# Altium schematic symbol library Capacitor - Ceramic - Sumsung.SchLib: 1421 symbols (part 5 of 8)
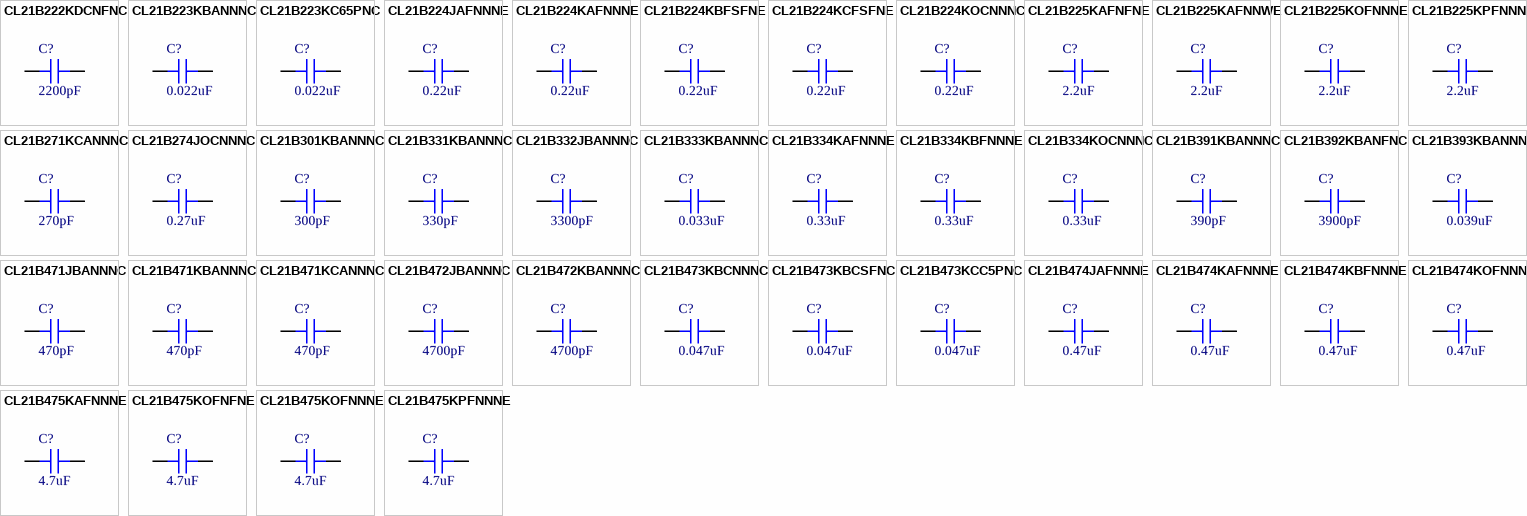
[diagram p39: symbols CL21B222KDCNFNC to CL21B475KPFNNNE]

## CL21B225KAFNNWE
designator C?, comment 2.2uF
CAP CER 2.2UF 25V X7R 0805; Part Number: CL21B225KAFNNWE; Manufacturer: Samsung Electro-Mechanics America, Inc.; TemperatureRange: -55C ~ 125C; Tolerance: 10%; Value: 2.2uF; PartId: 13943; Supplier 1: Digi-Key; Supplier Part Number 1: 1276-2955-2-ND; ComponentLink1Description: Datasheet; ComponentLink1URL: //media.digikey.com/pdf/Data%20Sheets/Samsung%20PDFs/CL21B225KAFNNWE_Spec.pdf; ComponentLink2Description: Digi-Key Listing; ComponentLink2URL: https://www.digikey.com/product-detail/en/samsung-electro-mechanics-america-inc/CL21B225KAFNNWE/1276-2955-2-ND/3888613; TemperatureCoefficient: X7R; Voltage: 25V; Price: 0.0374; Device Package: 0805 (2012 Metric)
footprint CAP 0805/2012
pins: 1, 2

## CL21B225KOFNNNE
designator C?, comment 2.2uF
CAP CER 2.2UF 16V X7R 0805; Part Number: CL21B225KOFNNNE; Manufacturer: Samsung Electro-Mechanics America, Inc.; TemperatureRange: -55C ~ 125C; Tolerance: 10%; Value: 2.2uF; PartId: 13949; Supplier 1: Digi-Key; Supplier Part Number 1: 1276-1162-2-ND; ComponentLink1Description: Datasheet; ComponentLink1URL: http://www.samsungsem.com/kr/support/product-search/mlcc/CL21B225KOFNNNE.jsp; ComponentLink2Description: Digi-Key Listing; ComponentLink2URL: https://www.digikey.com/product-detail/en/samsung-electro-mechanics-america-inc/CL21B225KOFNNNE/1276-1162-2-ND/3886820; TemperatureCoefficient: X7R; Voltage: 16V; Price: 0.033; Device Package: 0805 (2012 Metric)
footprint CAP 0805/2012
pins: 1, 2

## CL21B225KPFNNNE
designator C?, comment 2.2uF
CAP CER 2.2UF 10V X7R 0805; Part Number: CL21B225KPFNNNE; Manufacturer: Samsung Electro-Mechanics America, Inc.; TemperatureRange: -55C ~ 125C; Tolerance: 10%; Value: 2.2uF; PartId: 5880; Supplier 1: Digi-Key; Supplier Part Number 1: 1276-1188-2-ND; ComponentLink1Description: Datasheet; ComponentLink1URL: http://www.samsungsem.com/kr/support/product-search/mlcc/CL21B225KPFNNNE.jsp; ComponentLink2Description: Digi-Key listing; ComponentLink2URL: http://digikey.com/product-detail/en/CL21B225KPFNNNE/1276-1188-2-ND/3886846; TemperatureCoefficient: X7R; Voltage: 10V; Price: 0.0314; Type: -; Device Package: 0805 (2012 Metric)
footprint CAP 0805/2012
pins: 1, 2

## CL21B271KCANNNC
designator C?, comment 270pF
CAP CER 270PF 100V X7R 0805; Part Number: CL21B271KCANNNC; Manufacturer: Samsung Electro-Mechanics America, Inc.; TemperatureRange: -55C ~ 125C; Tolerance: 10%; Value: 270pF; PartId: 5693; Supplier 1: Digi-Key; Supplier Part Number 1: 1276-2494-2-ND; ComponentLink1Description: Datasheet; ComponentLink1URL: http://media.digikey.com/pdf/Data%20Sheets/Samsung%20PDFs/CL21B271KCANNNC_Spec.pdf; ComponentLink2Description: Digi-Key listing; ComponentLink2URL: http://digikey.com/product-detail/en/CL21B271KCANNNC/1276-2494-2-ND/3888152; TemperatureCoefficient: X7R; Voltage: 100V; Price: 0.0078; Type: -; Device Package: 0805 (2012 Metric)
footprint CAP 0805/2012
pins: 1, 2

## CL21B274JOCNNNC
designator C?, comment 0.27uF
CAP CER 0.27UF 16V X7R 0805; Part Number: CL21B274JOCNNNC; Manufacturer: Samsung Electro-Mechanics America, Inc.; TemperatureRange: -55C ~ 125C; Tolerance: 5%; Value: 0.27uF; PartId: 5945; Supplier 1: Digi-Key; Supplier Part Number 1: 1276-2497-2-ND; ComponentLink1Description: Datasheet; ComponentLink1URL: http://www.samsungsem.com/kr/support/product-search/mlcc/CL21B274JOCNNNC.jsp; ComponentLink2Description: Digi-Key listing; ComponentLink2URL: http://digikey.com/product-detail/en/CL21B274JOCNNNC/1276-2497-2-ND/3888155; TemperatureCoefficient: X7R; Voltage: 16V; Price: 0.0457; Type: -; Device Package: 0805 (2012 Metric)
footprint CAP 0805/2012
pins: 1, 2

## CL21B301KBANNNC
designator C?, comment 300pF
CAP CER 300PF 50V X7R 0805; Part Number: CL21B301KBANNNC; Manufacturer: Samsung Electro-Mechanics America, Inc.; TemperatureRange: -55C ~ 125C; Tolerance: 10%; Value: 300pF; PartId: 5668; Supplier 1: Digi-Key; Supplier Part Number 1: 1276-2499-2-ND; ComponentLink1Description: Datasheet; ComponentLink1URL: http://www.samsungsem.com/kr/support/product-search/mlcc/CL21B301KBANNNC.jsp; ComponentLink2Description: Digi-Key listing; ComponentLink2URL: http://digikey.com/product-detail/en/CL21B301KBANNNC/1276-2499-2-ND/3888157; TemperatureCoefficient: X7R; Voltage: 50V; Price: 0.0051; Type: -; Device Package: 0805 (2012 Metric)
footprint CAP 0805/2012
pins: 1, 2

## CL21B331KBANNNC
designator C?, comment 330pF
CAP CER 330PF 50V X7R 0805; Part Number: CL21B331KBANNNC; Manufacturer: Samsung Electro-Mechanics America, Inc.; TemperatureRange: -55C ~ 125C; Tolerance: 10%; Value: 330pF; PartId: 5739; Supplier 1: Digi-Key; Supplier Part Number 1: 1276-1765-2-ND; ComponentLink1Description: Datasheet; ComponentLink1URL: http://www.samsungsem.com/kr/support/product-search/mlcc/CL21B331KBANNNC.jsp; ComponentLink2Description: Digi-Key listing; ComponentLink2URL: http://digikey.com/product-detail/en/CL21B331KBANNNC/1276-1765-2-ND/3887423; TemperatureCoefficient: X7R; Voltage: 50V; Price: 0.0153; Type: -; Device Package: 0805 (2012 Metric)
footprint CAP 0805/2012
pins: 1, 2

## CL21B332JBANNNC
designator C?, comment 3300pF
CAP CER 3300PF 50V X7R 0805; Part Number: CL21B332JBANNNC; Manufacturer: Samsung Electro-Mechanics America, Inc.; TemperatureRange: -55C ~ 125C; Tolerance: 5%; Value: 3300pF; PartId: 5858; Supplier 1: Digi-Key; Supplier Part Number 1: 1276-2501-2-ND; ComponentLink1Description: Datasheet; ComponentLink1URL: http://www.samsungsem.com/kr/support/product-search/mlcc/CL21B332JBANNNC.jsp; ComponentLink2Description: Digi-Key listing; ComponentLink2URL: http://digikey.com/product-detail/en/CL21B332JBANNNC/1276-2501-2-ND/3888159; TemperatureCoefficient: X7R; Voltage: 50V; Price: 0.0263; Type: -; Device Package: 0805 (2012 Metric)
footprint CAP 0805/2012
pins: 1, 2

## CL21B333KBANNNC
designator C?, comment 0.033uF
CAP CER 0.033UF 50V X7R 0805; Part Number: CL21B333KBANNNC; Manufacturer: Samsung Electro-Mechanics America, Inc.; TemperatureRange: -55C ~ 125C; Tolerance: 10%; Value: 0.033uF; PartId: 14023; Supplier 1: Digi-Key; Supplier Part Number 1: 1276-1796-2-ND; ComponentLink1Description: Datasheet; ComponentLink1URL: http://www.samsungsem.com/kr/support/product-search/mlcc/CL21B333KBANNNC.jsp; ComponentLink2Description: Digi-Key Listing; ComponentLink2URL: https://www.digikey.com/product-detail/en/samsung-electro-mechanics-america-inc/CL21B333KBANNNC/1276-1796-2-ND/3887454; TemperatureCoefficient: X7R; Voltage: 50V; Price: 0.0135; Device Package: 0805 (2012 Metric)
footprint CAP 0805/2012
pins: 1, 2

## CL21B334KAFNNNE
designator C?, comment 0.33uF
CAP CER 0.33UF 25V X7R 0805; Part Number: CL21B334KAFNNNE; Manufacturer: Samsung Electro-Mechanics America, Inc.; TemperatureRange: -55C ~ 125C; Tolerance: 10%; Value: 0.33uF; PartId: 5949; Supplier 1: Digi-Key; Supplier Part Number 1: 1276-1808-2-ND; ComponentLink1Description: Datasheet; ComponentLink1URL: http://www.samsungsem.com/kr/support/product-search/mlcc/CL21B334KAFNNNE.jsp; ComponentLink2Description: Digi-Key listing; ComponentLink2URL: http://digikey.com/product-detail/en/CL21B334KAFNNNE/1276-1808-2-ND/3887466; TemperatureCoefficient: X7R; Voltage: 25V; Price: 0.0473; Type: -; Device Package: 0805 (2012 Metric)
footprint CAP 0805/2012
pins: 1, 2

## CL21B334KBFNNNE
designator C?, comment 0.33uF
CAP CER 0.33UF 50V X7R 0805; Part Number: CL21B334KBFNNNE; Manufacturer: Samsung Electro-Mechanics America, Inc.; TemperatureRange: -55C ~ 125C; Tolerance: 10%; Value: 0.33uF; PartId: 13967; Supplier 1: Digi-Key; Supplier Part Number 1: 1276-1123-2-ND; ComponentLink1Description: Datasheet; ComponentLink1URL: http://www.samsungsem.com/kr/support/product-search/mlcc/CL21B334KBFNNNE.jsp; ComponentLink2Description: Digi-Key Listing; ComponentLink2URL: https://www.digikey.com/product-detail/en/samsung-electro-mechanics-america-inc/CL21B334KBFNNNE/1276-1123-2-ND/3886781; TemperatureCoefficient: X7R; Voltage: 50V; Price: 0.029; Device Package: 0805 (2012 Metric)
footprint CAP 0805/2012
pins: 1, 2

## CL21B334KOCNNNC
designator C?, comment 0.33uF
CAP CER 0.33UF 16V X7R 0805; Part Number: CL21B334KOCNNNC; Manufacturer: Samsung Electro-Mechanics America, Inc.; TemperatureRange: -55C ~ 125C; Tolerance: 10%; Value: 0.33uF; PartId: 5916; Supplier 1: Digi-Key; Supplier Part Number 1: 1276-1797-2-ND; ComponentLink1Description: Datasheet; ComponentLink1URL: http://www.samsungsem.com/kr/support/product-search/mlcc/CL21B334KOCNNNC.jsp; ComponentLink2Description: Digi-Key listing; ComponentLink2URL: http://digikey.com/product-detail/en/CL21B334KOCNNNC/1276-1797-2-ND/3887455; TemperatureCoefficient: X7R; Voltage: 16V; Price: 0.0386; Type: -; Device Package: 0805 (2012 Metric)
footprint CAP 0805/2012
pins: 1, 2

## CL21B391KBANNNC
designator C?, comment 390pF
CAP CER 390PF 50V X7R 0805; Part Number: CL21B391KBANNNC; Manufacturer: Samsung Electro-Mechanics America, Inc.; TemperatureRange: -55C ~ 125C; Tolerance: 10%; Value: 390pF; PartId: 5742; Supplier 1: Digi-Key; Supplier Part Number 1: 1276-2510-2-ND; ComponentLink1Description: Datasheet; ComponentLink1URL: http://www.samsungsem.com/kr/support/product-search/mlcc/CL21B391KBANNNC.jsp; ComponentLink2Description: Digi-Key listing; ComponentLink2URL: http://digikey.com/product-detail/en/CL21B391KBANNNC/1276-2510-2-ND/3888168; TemperatureCoefficient: X7R; Voltage: 50V; Price: 0.0153; Type: -; Device Package: 0805 (2012 Metric)
footprint CAP 0805/2012
pins: 1, 2

## CL21B392KBANFNC
designator C?, comment 3900pF
CAP CER 3900PF 50V X7R 0805; Part Number: CL21B392KBANFNC; Manufacturer: Samsung Electro-Mechanics America, Inc.; TemperatureRange: -55C ~ 125C; Tolerance: 10%; Value: 3900pF; PartId: 5735; Supplier 1: Digi-Key; Supplier Part Number 1: 1276-2511-2-ND; ComponentLink1Description: Datasheet; ComponentLink1URL: http://media.digikey.com/pdf/Data%20Sheets/Samsung%20PDFs/CL21B392KBANFNC_Spec.pdf; ComponentLink2Description: Digi-Key listing; ComponentLink2URL: http://digikey.com/product-detail/en/CL21B392KBANFNC/1276-2511-2-ND/3888169; TemperatureCoefficient: X7R; Voltage: 50V; Price: 0.015; Type: -; Device Package: 0805 (2012 Metric)
footprint CAP 0805/2012
pins: 1, 2

## CL21B393KBANNNC
designator C?, comment 0.039uF
CAP CER 0.039UF 50V X7R 0805; Part Number: CL21B393KBANNNC; Manufacturer: Samsung Electro-Mechanics America, Inc.; TemperatureRange: -55C ~ 125C; Tolerance: 10%; Value: 0.039uF; PartId: 5862; Supplier 1: Digi-Key; Supplier Part Number 1: 1276-2513-2-ND; ComponentLink1Description: Datasheet; ComponentLink1URL: http://www.samsungsem.com/kr/support/product-search/mlcc/CL21B393KBANNNC.jsp; ComponentLink2Description: Digi-Key listing; ComponentLink2URL: http://digikey.com/product-detail/en/CL21B393KBANNNC/1276-2513-2-ND/3888171; TemperatureCoefficient: X7R; Voltage: 50V; Price: 0.0277; Type: -; Device Package: 0805 (2012 Metric)
footprint CAP 0805/2012
pins: 1, 2

## CL21B471JBANNNC
designator C?, comment 470pF
CAP CER 470PF 50V X7R 0805; Part Number: CL21B471JBANNNC; Manufacturer: Samsung Electro-Mechanics America, Inc.; TemperatureRange: -55C ~ 125C; Tolerance: 5%; Value: 470pF; PartId: 5833; Supplier 1: Digi-Key; Supplier Part Number 1: 1276-2514-2-ND; ComponentLink1Description: Datasheet; ComponentLink1URL: http://www.samsungsem.com/kr/support/product-search/mlcc/CL21B471JBANNNC.jsp; ComponentLink2Description: Digi-Key listing; ComponentLink2URL: http://digikey.com/product-detail/en/CL21B471JBANNNC/1276-2514-2-ND/3888172; TemperatureCoefficient: X7R; Voltage: 50V; Price: 0.023; Type: -; Device Package: 0805 (2012 Metric)
footprint CAP 0805/2012
pins: 1, 2

## CL21B471KBANNNC
designator C?, comment 470pF
CAP CER 470PF 50V X7R 0805; Part Number: CL21B471KBANNNC; Manufacturer: Samsung Electro-Mechanics America, Inc.; TemperatureRange: -55C ~ 125C; Tolerance: 10%; Value: 470pF; PartId: 14131; Supplier 1: Digi-Key; Supplier Part Number 1: 1276-1300-2-ND; ComponentLink1Description: Datasheet; ComponentLink1URL: http://www.samsungsem.com/kr/support/product-search/mlcc/CL21B471KBANNNC.jsp; ComponentLink2Description: Digi-Key Listing; ComponentLink2URL: https://www.digikey.com/product-detail/en/samsung-electro-mechanics-america-inc/CL21B471KBANNNC/1276-1300-2-ND/3886958; TemperatureCoefficient: X7R; Voltage: 50V; Price: 0.0101; Device Package: 0805 (2012 Metric)
footprint CAP 0805/2012
pins: 1, 2

## CL21B471KCANNNC
designator C?, comment 470pF
CAP CER 470PF 100V X7R 0805; Part Number: CL21B471KCANNNC; Manufacturer: Samsung Electro-Mechanics America, Inc.; TemperatureRange: -55C ~ 125C; Tolerance: 10%; Value: 470pF; PartId: 14181; Supplier 1: Digi-Key; Supplier Part Number 1: 1276-2516-2-ND; ComponentLink1Description: Datasheet; ComponentLink1URL: //media.digikey.com/pdf/Data%20Sheets/Samsung%20PDFs/CL21B471KCANNNC_Spec.pdf; ComponentLink2Description: Digi-Key Listing; ComponentLink2URL: https://www.digikey.com/product-detail/en/samsung-electro-mechanics-america-inc/CL21B471KCANNNC/1276-2516-2-ND/3888174; TemperatureCoefficient: X7R; Voltage: 100V; Price: 0.017; Device Package: 0805 (2012 Metric)
footprint CAP 0805/2012
pins: 1, 2

## CL21B472JBANNNC
designator C?, comment 4700pF
CAP CER 4700PF 50V X7R 0805; Part Number: CL21B472JBANNNC; Manufacturer: Samsung Electro-Mechanics America, Inc.; TemperatureRange: -55C ~ 125C; Tolerance: 5%; Value: 4700pF; PartId: 5831; Supplier 1: Digi-Key; Supplier Part Number 1: 1276-2519-2-ND; ComponentLink1Description: Datasheet; ComponentLink1URL: http://www.samsungsem.com/kr/support/product-search/mlcc/CL21B472JBANNNC.jsp; ComponentLink2Description: Digi-Key listing; ComponentLink2URL: http://digikey.com/product-detail/en/CL21B472JBANNNC/1276-2519-2-ND/3888177; TemperatureCoefficient: X7R; Voltage: 50V; Price: 0.023; Type: -; Device Package: 0805 (2012 Metric)
footprint CAP 0805/2012
pins: 1, 2

## CL21B472KBANNNC
designator C?, comment 4700pF
CAP CER 4700PF 50V X7R 0805; Part Number: CL21B472KBANNNC; Manufacturer: Samsung Electro-Mechanics America, Inc.; TemperatureRange: -55C ~ 125C; Tolerance: 10%; Value: 4700pF; PartId: 14058; Supplier 1: Digi-Key; Supplier Part Number 1: 1276-1155-2-ND; ComponentLink1Description: Datasheet; ComponentLink1URL: http://www.samsungsem.com/kr/support/product-search/mlcc/CL21B472KBANNNC.jsp; ComponentLink2Description: Digi-Key Listing; ComponentLink2URL: https://www.digikey.com/product-detail/en/samsung-electro-mechanics-america-inc/CL21B472KBANNNC/1276-1155-2-ND/3886813; TemperatureCoefficient: X7R; Voltage: 50V; Price: 0.0089; Device Package: 0805 (2012 Metric)
footprint CAP 0805/2012
pins: 1, 2

## CL21B473KBCNNNC
designator C?, comment 0.047uF
CAP CER 0.047UF 50V X7R 0805; Part Number: CL21B473KBCNNNC; Manufacturer: Samsung Electro-Mechanics America, Inc.; TemperatureRange: -55C ~ 125C; Tolerance: 10%; Value: 0.047uF; PartId: 14026; Supplier 1: Digi-Key; Supplier Part Number 1: 1276-1250-2-ND; ComponentLink1Description: Datasheet; ComponentLink1URL: http://www.samsungsem.com/kr/support/product-search/mlcc/CL21B473KBCNNNC.jsp; ComponentLink2Description: Digi-Key Listing; ComponentLink2URL: https://www.digikey.com/product-detail/en/samsung-electro-mechanics-america-inc/CL21B473KBCNNNC/1276-1250-2-ND/3886908; TemperatureCoefficient: X7R; Voltage: 50V; Price: 0.011; Device Package: 0805 (2012 Metric)
footprint CAP 0805/2012
pins: 1, 2

## CL21B473KBCSFNC
designator C?, comment 0.047uF
CAP CER 0.047UF 50V X7R 0805; Part Number: CL21B473KBCSFNC; Manufacturer: Samsung Electro-Mechanics America, Inc.; TemperatureRange: -55C ~ 125C; Tolerance: 10%; Value: 0.047uF; PartId: 14161; Supplier 1: Digi-Key; Supplier Part Number 1: 1276-2531-2-ND; ComponentLink1Description: Datasheet; ComponentLink1URL: //media.digikey.com/pdf/Data%20Sheets/Samsung%20PDFs/CL21B473KBCSFNC_Spec.pdf; ComponentLink2Description: Digi-Key Listing; ComponentLink2URL: https://www.digikey.com/product-detail/en/samsung-electro-mechanics-america-inc/CL21B473KBCSFNC/1276-2531-2-ND/3888189; TemperatureCoefficient: X7R; Voltage: 50V; Price: 0.011; Device Package: 0805 (2012 Metric)
footprint CAP 0805/2012
pins: 1, 2

## CL21B473KCC5PNC
designator C?, comment 0.047uF
CAP CER 0.047UF 100V X7R 0805; Part Number: CL21B473KCC5PNC; Manufacturer: Samsung Electro-Mechanics America, Inc.; TemperatureRange: -55C ~ 125C; Tolerance: 10%; Value: 0.047uF; PartId: 14295; Supplier 1: Digi-Key; Supplier Part Number 1: 1276-2532-2-ND; ComponentLink1Description: Datasheet; ComponentLink1URL: //media.digikey.com/pdf/Data%20Sheets/Samsung%20PDFs/CL21B473KCC5PNC_Spec.pdf; ComponentLink2Description: Digi-Key Listing; ComponentLink2URL: https://www.digikey.com/product-detail/en/samsung-electro-mechanics-america-inc/CL21B473KCC5PNC/1276-2532-2-ND/3888190; TemperatureCoefficient: X7R; Voltage: 100V; Price: 0.0212; Device Package: 0805 (2012 Metric)
footprint CAP 0805/2012
pins: 1, 2

## CL21B474JAFNNNE
designator C?, comment 0.47uF
CAP CER 0.47UF 25V X7R 0805; Part Number: CL21B474JAFNNNE; Manufacturer: Samsung Electro-Mechanics America, Inc.; TemperatureRange: -55C ~ 125C; Tolerance: 5%; Value: 0.47uF; PartId: 6019; Supplier 1: Digi-Key; Supplier Part Number 1: 1276-2961-2-ND; ComponentLink1Description: Datasheet; ComponentLink1URL: http://www.samsungsem.com/kr/support/product-search/mlcc/CL21B474JAFNNNE.jsp; ComponentLink2Description: Digi-Key listing; ComponentLink2URL: http://digikey.com/product-detail/en/CL21B474JAFNNNE/1276-2961-2-ND/3888619; TemperatureCoefficient: X7R; Voltage: 25V; Price: 0.0717; Type: -; Device Package: 0805 (2012 Metric)
footprint CAP 0805/2012
pins: 1, 2

## CL21B474KAFNNNE
designator C?, comment 0.47uF
CAP CER 0.47UF 25V X7R 0805; Part Number: CL21B474KAFNNNE; Manufacturer: Samsung Electro-Mechanics America, Inc.; TemperatureRange: -55C ~ 125C; Tolerance: 10%; Value: 0.47uF; PartId: 13977; Supplier 1: Digi-Key; Supplier Part Number 1: 1276-1074-2-ND; ComponentLink1Description: Datasheet; ComponentLink1URL: http://www.samsungsem.com/kr/support/product-search/mlcc/CL21B474KAFNNNE.jsp; ComponentLink2Description: Digi-Key Listing; ComponentLink2URL: https://www.digikey.com/product-detail/en/samsung-electro-mechanics-america-inc/CL21B474KAFNNNE/1276-1074-2-ND/3886732; TemperatureCoefficient: X7R; Voltage: 25V; Price: 0.0199; Device Package: 0805 (2012 Metric)
footprint CAP 0805/2012
pins: 1, 2

## CL21B474KBFNNNE
designator C?, comment 0.47uF
CAP CER 0.47UF 50V X7R 0805; Part Number: CL21B474KBFNNNE; Manufacturer: Samsung Electro-Mechanics America, Inc.; TemperatureRange: -55C ~ 125C; Tolerance: 10%; Value: 0.47uF; PartId: 13830; Supplier 1: Digi-Key; Supplier Part Number 1: 1276-1039-2-ND; ComponentLink1Description: Datasheet; ComponentLink1URL: http://www.samsungsem.com/kr/support/product-search/mlcc/CL21B474KBFNNNE.jsp; ComponentLink2Description: Digi-Key Listing; ComponentLink2URL: https://www.digikey.com/product-detail/en/samsung-electro-mechanics-america-inc/CL21B474KBFNNNE/1276-1039-2-ND/3886697; TemperatureCoefficient: X7R; Voltage: 50V; Price: 0.0475; Device Package: 0805 (2012 Metric)
footprint CAP 0805/2012
pins: 1, 2

## CL21B474KOFNNNE
designator C?, comment 0.47uF
CAP CER 0.47UF 16V X7R 0805; Part Number: CL21B474KOFNNNE; Manufacturer: Samsung Electro-Mechanics America, Inc.; TemperatureRange: -55C ~ 125C; Tolerance: 10%; Value: 0.47uF; PartId: 5854; Supplier 1: Digi-Key; Supplier Part Number 1: 1276-1199-2-ND; ComponentLink1Description: Datasheet; ComponentLink1URL: http://www.samsungsem.com/kr/support/product-search/mlcc/CL21B474KOFNNNE.jsp; ComponentLink2Description: Digi-Key listing; ComponentLink2URL: http://digikey.com/product-detail/en/CL21B474KOFNNNE/1276-1199-2-ND/3886857; TemperatureCoefficient: X7R; Voltage: 16V; Price: 0.0251; Type: -; Device Package: 0805 (2012 Metric)
footprint CAP 0805/2012
pins: 1, 2

## CL21B475KAFNNNE
designator C?, comment 4.7uF
CAP CER 4.7UF 25V X7R 0805; Part Number: CL21B475KAFNNNE; Manufacturer: Samsung Electro-Mechanics America, Inc.; TemperatureRange: -55C ~ 125C; Tolerance: 10%; Value: 4.7uF; PartId: 14191; Supplier 1: Digi-Key; Supplier Part Number 1: 1276-2969-2-ND; ComponentLink1Description: Datasheet; ComponentLink1URL: //media.digikey.com/pdf/Data%20Sheets/Samsung%20PDFs/CL21B475KAFNNNE_Spec.pdf; ComponentLink2Description: Digi-Key Listing; ComponentLink2URL: https://www.digikey.com/product-detail/en/samsung-electro-mechanics-america-inc/CL21B475KAFNNNE/1276-2969-2-ND/3888627; TemperatureCoefficient: X7R; Voltage: 25V; Price: 0.0834; Device Package: 0805 (2012 Metric)
footprint CAP 0805/2012
pins: 1, 2

## CL21B475KOFNFNE
designator C?, comment 4.7uF
CAP CER 4.7UF 16V X7R 0805; Part Number: CL21B475KOFNFNE; Manufacturer: Samsung Electro-Mechanics America, Inc.; TemperatureRange: -55C ~ 125C; Tolerance: 10%; Value: 4.7uF; PartId: 14257; Supplier 1: Digi-Key; Supplier Part Number 1: 1276-2970-2-ND; ComponentLink1Description: Datasheet; ComponentLink1URL: //media.digikey.com/pdf/Data%20Sheets/Samsung%20PDFs/CL21B475KOFNFNE_Spec.pdf; ComponentLink2Description: Digi-Key Listing; ComponentLink2URL: https://www.digikey.com/product-detail/en/samsung-electro-mechanics-america-inc/CL21B475KOFNFNE/1276-2970-2-ND/3888628; TemperatureCoefficient: X7R; Voltage: 16V; Price: 0.0506; Device Package: 0805 (2012 Metric)
footprint CAP 0805/2012
pins: 1, 2

## CL21B475KOFNNNE
designator C?, comment 4.7uF
CAP CER 4.7UF 16V X7R 0805; Part Number: CL21B475KOFNNNE; Manufacturer: Samsung Electro-Mechanics America, Inc.; TemperatureRange: -55C ~ 125C; Tolerance: 10%; Value: 4.7uF; PartId: 14104; Supplier 1: Digi-Key; Supplier Part Number 1: 1276-2873-2-ND; ComponentLink1Description: Datasheet; ComponentLink1URL: http://www.samsungsem.com/kr/support/product-search/mlcc/CL21B475KOFNNNE.jsp; ComponentLink2Description: Digi-Key Listing; ComponentLink2URL: https://www.digikey.com/product-detail/en/samsung-electro-mechanics-america-inc/CL21B475KOFNNNE/1276-2873-2-ND/3888531; TemperatureCoefficient: X7R; Voltage: 16V; Price: 0.0513; Device Package: 0805 (2012 Metric)
footprint CAP 0805/2012
pins: 1, 2

## CL21B475KPFNNNE
designator C?, comment 4.7uF
CAP CER 4.7UF 10V X7R 0805; Part Number: CL21B475KPFNNNE; Manufacturer: Samsung Electro-Mechanics America, Inc.; TemperatureRange: -55C ~ 125C; Tolerance: 10%; Value: 4.7uF; PartId: 13993; Supplier 1: Digi-Key; Supplier Part Number 1: 1276-2972-2-ND; ComponentLink1Description: Datasheet; ComponentLink1URL: http://www.samsungsem.com/kr/support/product-search/mlcc/CL21B475KPFNNNE.jsp; ComponentLink2Description: Digi-Key Listing; ComponentLink2URL: https://www.digikey.com/product-detail/en/samsung-electro-mechanics-america-inc/CL21B475KPFNNNE/1276-2972-2-ND/3888630; TemperatureCoefficient: X7R; Voltage: 10V; Price: 0.0363; Device Package: 0805 (2012 Metric)
footprint CAP 0805/2012
pins: 1, 2

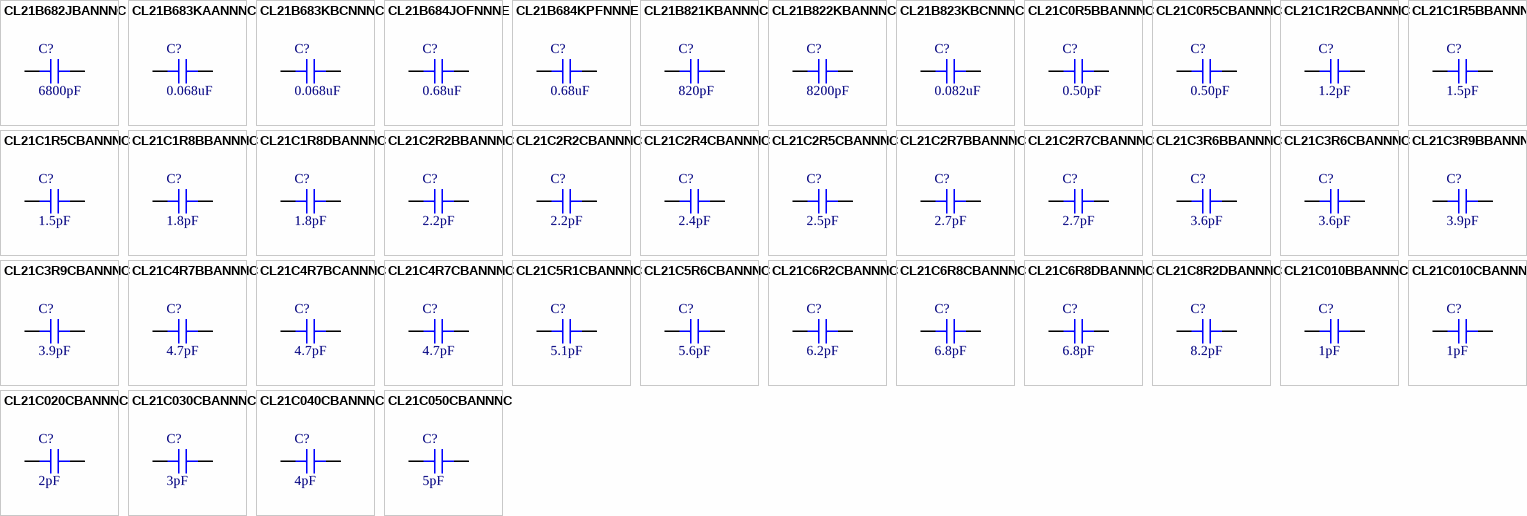
[diagram p20: symbols CL21B682JBANNNC to CL21C050CBANNNC]

## CL21B682JBANNNC
designator C?, comment 6800pF
CAP CER 6800PF 50V X7R 0805; Part Number: CL21B682JBANNNC; Manufacturer: Samsung Electro-Mechanics America, Inc.; TemperatureRange: -55C ~ 125C; Tolerance: 5%; Value: 6800pF; PartId: 5834; Supplier 1: Digi-Key; Supplier Part Number 1: 1276-2539-2-ND; ComponentLink1Description: Datasheet; ComponentLink1URL: http://www.samsungsem.com/kr/support/product-search/mlcc/CL21B682JBANNNC.jsp; ComponentLink2Description: Digi-Key listing; ComponentLink2URL: http://digikey.com/product-detail/en/CL21B682JBANNNC/1276-2539-2-ND/3888197; TemperatureCoefficient: X7R; Voltage: 50V; Price: 0.023; Type: -; Device Package: 0805 (2012 Metric)
footprint CAP 0805/2012
pins: 1, 2

## CL21B683KAANNNC
designator C?, comment 0.068uF
CAP CER 0.068UF 25V X7R 0805; Part Number: CL21B683KAANNNC; Manufacturer: Samsung Electro-Mechanics America, Inc.; TemperatureRange: -55C ~ 125C; Tolerance: 10%; Value: 0.068uF; PartId: 5878; Supplier 1: Digi-Key; Supplier Part Number 1: 1276-2541-2-ND; ComponentLink1Description: Datasheet; ComponentLink1URL: http://www.samsungsem.com/kr/support/product-search/mlcc/CL21B683KAANNNC.jsp; ComponentLink2Description: Digi-Key listing; ComponentLink2URL: http://digikey.com/product-detail/en/CL21B683KAANNNC/1276-2541-2-ND/3888199; TemperatureCoefficient: X7R; Voltage: 25V; Price: 0.0308; Type: -; Device Package: 0805 (2012 Metric)
footprint CAP 0805/2012
pins: 1, 2

## CL21B683KBCNNNC
designator C?, comment 0.068uF
CAP CER 0.068UF 50V X7R 0805; Part Number: CL21B683KBCNNNC; Manufacturer: Samsung Electro-Mechanics America, Inc.; TemperatureRange: -55C ~ 125C; Tolerance: 10%; Value: 0.068uF; PartId: 5867; Supplier 1: Digi-Key; Supplier Part Number 1: 1276-1251-2-ND; ComponentLink1Description: Datasheet; ComponentLink1URL: http://www.samsungsem.com/kr/support/product-search/mlcc/CL21B683KBCNNNC.jsp; ComponentLink2Description: Digi-Key listing; ComponentLink2URL: http://digikey.com/product-detail/en/CL21B683KBCNNNC/1276-1251-2-ND/3886909; TemperatureCoefficient: X7R; Voltage: 50V; Price: 0.0286; Type: -; Device Package: 0805 (2012 Metric)
footprint CAP 0805/2012
pins: 1, 2

## CL21B684JOFNNNE
designator C?, comment 0.68uF
CAP CER 0.68UF 16V X7R 0805; Part Number: CL21B684JOFNNNE; Manufacturer: Samsung Electro-Mechanics America, Inc.; TemperatureRange: -55C ~ 125C; Tolerance: 5%; Value: 0.68uF; PartId: 5873; Supplier 1: Digi-Key; Supplier Part Number 1: 1276-2976-2-ND; ComponentLink1Description: Datasheet; ComponentLink1URL: http://www.samsungsem.com/kr/support/product-search/mlcc/CL21B684JOFNNNE.jsp; ComponentLink2Description: Digi-Key listing; ComponentLink2URL: http://digikey.com/product-detail/en/CL21B684JOFNNNE/1276-2976-2-ND/3888634; TemperatureCoefficient: X7R; Voltage: 16V; Price: 0.0299; Type: -; Device Package: 0805 (2012 Metric)
footprint CAP 0805/2012
pins: 1, 2

## CL21B684KPFNNNE
designator C?, comment 0.68uF
CAP CER 0.68UF 10V X7R 0805; Part Number: CL21B684KPFNNNE; Manufacturer: Samsung Electro-Mechanics America, Inc.; TemperatureRange: -55C ~ 125C; Tolerance: 10%; Value: 0.68uF; PartId: 5923; Supplier 1: Digi-Key; Supplier Part Number 1: 1276-2979-2-ND; ComponentLink1Description: Datasheet; ComponentLink1URL: http://www.samsungsem.com/kr/support/product-search/mlcc/CL21B684KPFNNNE.jsp; ComponentLink2Description: Digi-Key listing; ComponentLink2URL: http://digikey.com/product-detail/en/CL21B684KPFNNNE/1276-2979-2-ND/3888637; TemperatureCoefficient: X7R; Voltage: 10V; Price: 0.0405; Type: -; Device Package: 0805 (2012 Metric)
footprint CAP 0805/2012
pins: 1, 2

## CL21B821KBANNNC
designator C?, comment 820pF
CAP CER 820PF 50V X7R 0805; Part Number: CL21B821KBANNNC; Manufacturer: Samsung Electro-Mechanics America, Inc.; TemperatureRange: -55C ~ 125C; Tolerance: 10%; Value: 820pF; PartId: 5744; Supplier 1: Digi-Key; Supplier Part Number 1: 1276-2544-2-ND; ComponentLink1Description: Datasheet; ComponentLink1URL: http://www.samsungsem.com/kr/support/product-search/mlcc/CL21B821KBANNNC.jsp; ComponentLink2Description: Digi-Key listing; ComponentLink2URL: http://digikey.com/product-detail/en/CL21B821KBANNNC/1276-2544-2-ND/3888202; TemperatureCoefficient: X7R; Voltage: 50V; Price: 0.0153; Type: -; Device Package: 0805 (2012 Metric)
footprint CAP 0805/2012
pins: 1, 2

## CL21B822KBANNNC
designator C?, comment 8200pF
CAP CER 8200PF 50V X7R 0805; Part Number: CL21B822KBANNNC; Manufacturer: Samsung Electro-Mechanics America, Inc.; TemperatureRange: -55C ~ 125C; Tolerance: 10%; Value: 8200pF; PartId: 5738; Supplier 1: Digi-Key; Supplier Part Number 1: 1276-2546-2-ND; ComponentLink1Description: Datasheet; ComponentLink1URL: http://www.samsungsem.com/kr/support/product-search/mlcc/CL21B822KBANNNC.jsp; ComponentLink2Description: Digi-Key listing; ComponentLink2URL: http://digikey.com/product-detail/en/CL21B822KBANNNC/1276-2546-2-ND/3888204; TemperatureCoefficient: X7R; Voltage: 50V; Price: 0.0153; Type: -; Device Package: 0805 (2012 Metric)
footprint CAP 0805/2012
pins: 1, 2

## CL21B823KBCNNNC
designator C?, comment 0.082uF
CAP CER 0.082UF 50V X7R 0805; Part Number: CL21B823KBCNNNC; Manufacturer: Samsung Electro-Mechanics America, Inc.; TemperatureRange: -55C ~ 125C; Tolerance: 10%; Value: 0.082uF; PartId: 5876; Supplier 1: Digi-Key; Supplier Part Number 1: 1276-2547-2-ND; ComponentLink1Description: Datasheet; ComponentLink1URL: http://www.samsungsem.com/kr/support/product-search/mlcc/CL21B823KBCNNNC.jsp; ComponentLink2Description: Digi-Key listing; ComponentLink2URL: http://digikey.com/product-detail/en/CL21B823KBCNNNC/1276-2547-2-ND/3888205; TemperatureCoefficient: X7R; Voltage: 50V; Price: 0.0308; Type: -; Device Package: 0805 (2012 Metric)
footprint CAP 0805/2012
pins: 1, 2

## CL21C0R5BBANNNC
designator C?, comment 0.50pF
CAP CER 0.50PF 50V NP0 0805; Part Number: CL21C0R5BBANNNC; Manufacturer: Samsung Electro-Mechanics America, Inc.; TemperatureRange: -55C ~ 125C; TemperatureCoefficient: C0G, NP0; Tolerance: 0.1pF; Value: 0.50pF; PartId: 5684; Supplier 1: Digi-Key; Supplier Part Number 1: 1276-1200-2-ND; ComponentLink1Description: Datasheet; ComponentLink1URL: http://www.samsungsem.com/kr/support/product-search/mlcc/CL21C0R5BBANNNC.jsp; ComponentLink2Description: Digi-Key listing; ComponentLink2URL: http://digikey.com/product-detail/en/CL21C0R5BBANNNC/1276-1200-2-ND/3886858; Voltage: 50V; Price: 0.0065; Type: -; Device Package: 0805 (2012 Metric)
footprint CAP 0805/2012
pins: 1, 2

## CL21C0R5CBANNNC
designator C?, comment 0.50pF
CAP CER 0.50PF 50V NP0 0805; Part Number: CL21C0R5CBANNNC; Manufacturer: Samsung Electro-Mechanics America, Inc.; TemperatureRange: -55C ~ 125C; TemperatureCoefficient: C0G, NP0; Tolerance: 0.25pF; Value: 0.50pF; PartId: 5774; Supplier 1: Digi-Key; Supplier Part Number 1: 1276-2560-2-ND; ComponentLink1Description: Datasheet; ComponentLink1URL: http://www.samsungsem.com/kr/support/product-search/mlcc/CL21C0R5CBANNNC.jsp; ComponentLink2Description: Digi-Key listing; ComponentLink2URL: http://digikey.com/product-detail/en/CL21C0R5CBANNNC/1276-2560-2-ND/3888218; Voltage: 50V; Price: 0.0163; Type: -; Device Package: 0805 (2012 Metric)
footprint CAP 0805/2012
pins: 1, 2

## CL21C1R2CBANNNC
designator C?, comment 1.2pF
CAP CER 1.2PF 50V NP0 0805; Part Number: CL21C1R2CBANNNC; Manufacturer: Samsung Electro-Mechanics America, Inc.; TemperatureRange: -55C ~ 125C; TemperatureCoefficient: C0G, NP0; Tolerance: 0.25pF; Value: 1.2pF; PartId: 5766; Supplier 1: Digi-Key; Supplier Part Number 1: 1276-2596-2-ND; ComponentLink1Description: Datasheet; ComponentLink1URL: http://www.samsungsem.com/kr/support/product-search/mlcc/CL21C1R2CBANNNC.jsp; ComponentLink2Description: Digi-Key listing; ComponentLink2URL: http://digikey.com/product-detail/en/CL21C1R2CBANNNC/1276-2596-2-ND/3888254; Voltage: 50V; Price: 0.0163; Type: -; Device Package: 0805 (2012 Metric)
footprint CAP 0805/2012
pins: 1, 2

## CL21C1R5BBANNNC
designator C?, comment 1.5pF
CAP CER 1.5PF 50V NP0 0805; Part Number: CL21C1R5BBANNNC; Manufacturer: Samsung Electro-Mechanics America, Inc.; TemperatureRange: -55C ~ 125C; TemperatureCoefficient: C0G, NP0; Tolerance: 0.1pF; Value: 1.5pF; PartId: 5687; Supplier 1: Digi-Key; Supplier Part Number 1: 1276-2597-2-ND; ComponentLink1Description: Datasheet; ComponentLink1URL: http://www.samsungsem.com/kr/support/product-search/mlcc/CL21C1R5BBANNNC.jsp; ComponentLink2Description: Digi-Key listing; ComponentLink2URL: http://digikey.com/product-detail/en/CL21C1R5BBANNNC/1276-2597-2-ND/3888255; Voltage: 50V; Price: 0.0068; Type: -; Device Package: 0805 (2012 Metric)
footprint CAP 0805/2012
pins: 1, 2

## CL21C1R5CBANNNC
designator C?, comment 1.5pF